# Altium footprint library ACTION标准库.pcblib: 504 footprints (part 4 of 32)
Each footprint in its own frame and in the unit in brackets; x right, y up, seen from the top. Pads: shape width x height; smd on the part's side, far side on the other; paste and mask are expansions set on the pad; w line width, h text height; cw(c..) or ccw(c..) is an arc to the next point about the centre after c.
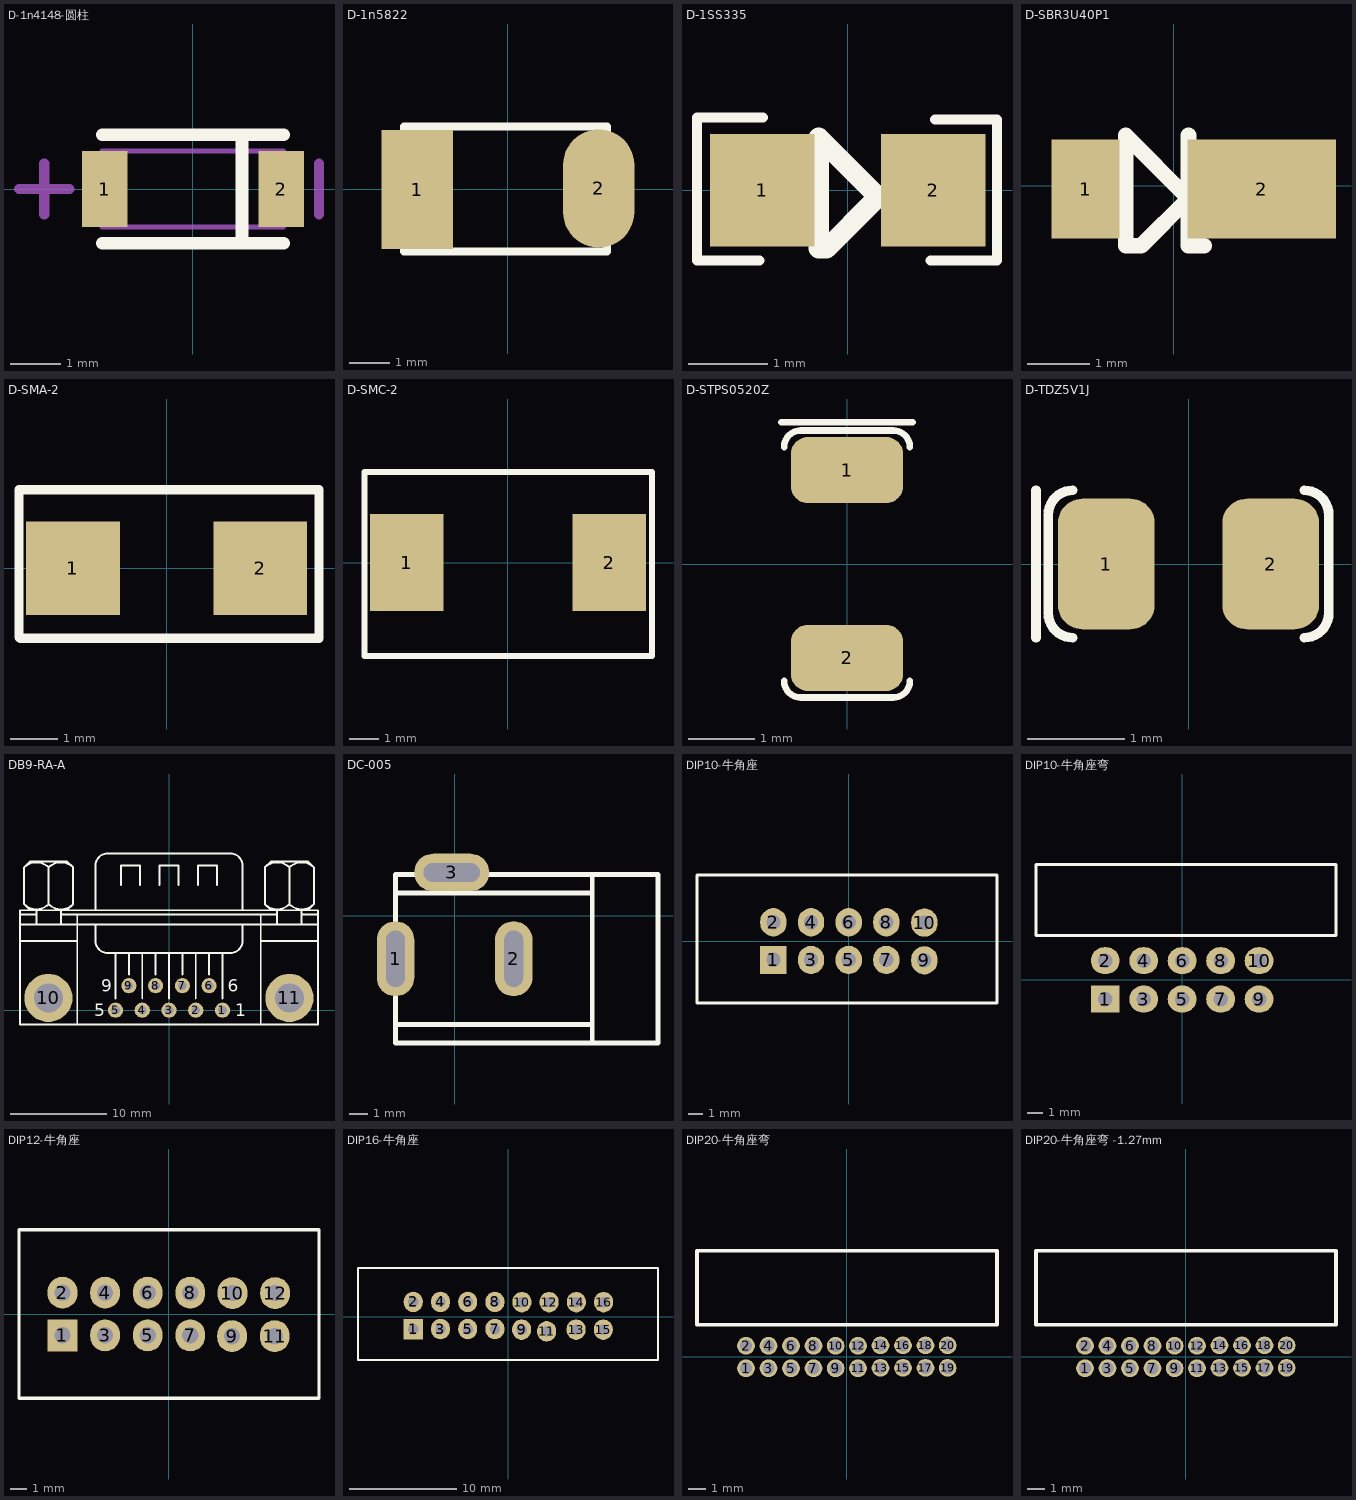
[diagram p3: the footprints below, top view; thin cyan lines are the x and y axes]

## D-1n4148-圆柱 [mm]
pads (2):
  rect 0.9x1.5 smd: 1(-1.75,0) 2(1.75,0)
Top Overlay:
  lines w0.254: -1.8,-1.075 1.8,-1.075 ; -1.8,1.075 1.8,1.075 ; 0.975,-1.075 0.975,1.075
Mechanical 13:
  lines w0.1: -1.8,-0.75 -1.8,0.75 1.8,0.75 1.8,-0.75 -1.8,-0.75
Mechanical 15:
  lines w0.203: -3.45,0 -2.45,0 ; -2.95,-0.5 -2.95,0.5 ; 2.5,-0.5 2.5,0.5
3D body "DIOMELF3414N.STEP": height 1.46, standoff 0.06, extent -1.675,-0.7 1.725,0.7

## D-1n5822 [mil]
pads (2):
  rect 70x116.3 smd: 1(-89,-0.5)
  oval 70x116.3 smd: 2(89,0.5)
Top Overlay:
  lines w7.87: -102,-61.5 97,-61.5 97,61.5 -102,61.5 -102,-61.5
3D body: height 51.18, standoff 0, extent -103,-60.5 97,59.5

## D-1SS335 [mil]
pads (2):
  rect 52x56 smd: 1(-42.5,0) 2(42.5,0)
Top Overlay:
  lines w5: -43.9,-34.84 -74.9,-34.84 -74.9,36 -42.06,36 ; 41.1,-34.84 74.1,-34.84 74.1,35 43.27,35
  lines w10: 13.11,-5.34 -10.51,-28.96 -14.45,-28.96 -14.45,26.16 13.11,-1.4 ; 13.11,-1.4 13.11,-1.4
3D body: height 70, standoff 0, extent -68.64,-28.4 68.36,27.6

## D-SBR3U40P1 [mm]
height 0.5
pads (2):
  rect 1.1x1.6 smd: 1(-1.422,-0.051)
  rect 2.4x1.6 smd: 2(1.422,-0.051)
Top Overlay:
  lines w0.254: 0.241,0.813 0.241,-0.965 0.495,-0.965 ; -0.775,-0.965 -0.775,0.813 0.241,-0.203 -0.521,-0.965 -0.775,-0.965
3D body "User Library-POWERDI-123.STEP": height 1.1, standoff 0.1, extent -1.62,-1.016 2.28,0.914

## D-SMA-2 [mm]
pads (2):
  rect 2x2 smd: 1(-2,0) 2(2,0)
Top Overlay:
  lines w0.2: -3.15,-1.473 -3.15,1.676 3.251,1.676 3.251,-1.499 -3.124,-1.499 -3.15,-1.473
3D body "DO214 SMA.STEP": height 2.41, standoff 0.13, extent -2.692,-1.295 2.794,1.499

## D-SMC-2 [mm]
pads (2):
  rect 2.5x3.3 smd: 1(-3.45,0) 2(3.45,0)
Top Overlay:
  lines w0.2: -4.877,-3.175 4.902,-3.175 4.902,3.073 -4.877,3.073 -4.877,-1.6 -4.877,-3.175
3D body "DO214 SMC.STEP": height 2.27, standoff -0.03, extent -3.899,-3.001 4.051,2.899

## D-STPS0520Z [mm] "肖特基二极管"
pads (2):
  rrect50% 1.7x1 smd: 1(0,1.425) 2(0,-1.425)
Top Overlay:
  lines w0.1: -1,2.152 1,2.152 ; -0.954,-1.771 ccw(c-0.7,-1.771) -0.7,-2.025 0.7,-2.025 ccw(c0.7,-1.771) 0.954,-1.771 ; -0.954,1.771 cw(c-0.7,1.771) -0.7,2.025 0.7,2.025 cw(c0.7,1.771) 0.954,1.771

## D-TDZ5V1J [mm]
pads (2):
  rrect50% 1x1.35 smd: 1(-0.85,0) 2(0.85,0)
Top Overlay:
  lines w0.1: -1.577,-0.762 -1.577,0.762 ; -1.196,-0.762 cw(c-1.196,-0.508) -1.45,-0.508 -1.45,0.508 cw(c-1.196,0.508) -1.196,0.762 ; 1.196,-0.762 ccw(c1.196,-0.508) 1.45,-0.508 1.45,0.508 ccw(c1.196,0.508) 1.196,0.762

## DB9-RA-A [mil]
pads (11):
  round 62 hole 35: 1(218.33,0) 2(109.17,0) 3(0,0) 4(-109.17,0) 5(-218.33,0) 6(163.75,100) 7(54.58,100) 8(-54.58,100) 9(-163.75,100)
  round 196.67 hole 118.33: 10(-492.5,50) 11(491.67,50)
Top Overlay:
  lines w7.87: -608.79,283.07 -374.54,283.07 ; -608.79,349.74 608.79,349.74 ; -608.79,391.4 -541.67,391.4 ; -591.75,432.99 ccw(c-541.67,483.07) -491.58,432.99 ; -591.75,583.16 cw(c-541.67,533.07) -491.58,583.16 ; -566.67,408.07 -591.67,433.07 -591.67,583.07 -566.67,608.07 -416.67,608.07 -391.67,583.07 -391.67,433.07 -416.67,408.07 ; -541.67,349.74 -541.67,408.07 ; -491.75,432.99 ccw(c-441.67,483.07) -391.58,432.99 ; -491.75,583.16 cw(c-441.67,533.07) -391.58,583.16 ; -491.67,433.07 -491.67,583.07 ; -441.67,349.74 -441.67,408.07 ; -441.67,391.4 440.83,391.4 ; -374.54,-59.06 -374.54,391.4 ; -300,349.74 -300,283.07 ccw(c-250,283.07) -250,233.07 ; -300,408.07 -300,590.55 cw(c-250,590.55) -250,640.55 250,640.55 cw(c250,590.55) 300,590.55 300,408.07 ; -218.33,47.24 -218.33,233.07 ; -196.85,511.81 -196.85,590.55 -118.11,590.55 -118.11,511.81 ; -163.75,145.67 -163.75,233.07 ; -109.17,47.24 -109.17,233.07 ; -54.58,145.67 -54.58,233.07 ; -39.37,511.81 -39.37,590.55 0,590.55 39.37,590.55 39.37,511.81 ; 0,47.24 0,233.07 -250,233.07 ; 54.58,145.67 54.58,233.07 ; 109.17,47.24 109.17,233.07 ; 118.11,511.81 118.11,590.55 196.85,590.55 196.85,511.81 ; 163.75,145.67 163.75,233.07 ; 218.33,47.24 218.33,233.07 ; 300,349.74 300,283.07 cw(c250,283.07) 250,233.07 -250,233.07 ; 374.54,-59.06 374.54,391.4 ; 374.54,283.07 608.79,283.07 ; 391.58,432.99 ccw(c441.67,483.07) 491.75,432.99 ; 391.58,583.16 cw(c441.67,533.07) 491.75,583.16 ; 416.67,408.07 391.67,433.07 391.67,583.07 416.67,608.07 566.67,608.07 591.67,583.07 591.67,433.07 566.67,408.07 ; 440.83,349.74 440.83,408.07 ; 491.58,432.99 ccw(c541.66,483.07) 591.75,432.99 ; 491.58,583.16 cw(c541.66,533.07) 591.75,583.16 ; 491.67,433.07 491.67,583.07 ; 540.83,349.74 540.83,408.07 ; 540.83,391.4 608.79,391.4 ; -608.79,-59.06 -366.67,-59.06 366.67,-59.06 608.79,-59.06 608.79,408.07 -608.79,408.07 -608.79,-59.06
  text "6" at 239.68,74.8 h50
  text "1" at 271.18,-25.59 h50
  text "5" at -304.46,-25.59 h50
  text "9" at -275.75,74.8 h50
3D body "User Library-DRB-9M.STEP": height 501.97, standoff -143.7, extent -599.29,-58.8 601.5,638.05

## DC-005 [mm]
pads (3):
  oval 2x4 hole 1 slot 3 at 90 deg: 1(-3.15,-2.3) 2(3.15,-2.3)
  oval 4x2 hole 1 slot 3 at 0 deg: 3(-0.15,2.3)
Top Overlay:
  lines w0.254: -3.15,-5.805 7.34,-5.805 ; -3.15,1.205 7.34,1.205 ; 7.34,-6.796 7.34,2.196 ; -3.15,-6.796 -3.15,2.196 10.845,2.196 10.845,-6.796 -3.15,-6.796
3D body "User Library-dc range - dc connector[4840_2201].STEP": height 11.02, standoff -3.48, extent -3.193,-6.803 10.633,2.703

## DIP10-牛角座 [mil]
pads (10):
  rect 70x75 hole 38: 1(-200.5,-49.5)
  oval 70x75 hole 38: 2(-200.5,50.5) 3(-100.5,-49.5) 4(-100.5,50.5) 5(-0.5,-49.5) 6(-0.5,50.5) 7(99.5,-49.5) 8(99.5,50.5) 9(200.5,-50.5) 10(200.5,49.5)
Top Overlay:
  lines w7.87: -403.5,-163.5 393.5,-163.5 393.5,175.5 -403.5,175.5 -403.5,-163.5
3D body "BH-10.STEP": height 348.1, standoff -129.92, extent -406.29,-171.7 395.29,190.5

## DIP10-牛角座弯 [mil] "Connector; Header; 7x2 Position"
height 23.62
pads (10):
  rect 75x70 hole 38: 1(-200,-50)
  oval 75x70 hole 38: 2(-200,50) 3(-100,-50) 4(-100,50) 5(0,-50) 6(0,50) 7(100,-50) 8(100,50) 9(200,-50) 10(200,50)
Top Overlay:
  lines w7.87: -380,115 -380,300 400,300 400,115 -380,115

## DIP12-牛角座 [mil]
pads (12):
  rect 70x75 hole 38: 1(-249.5,-49)
  oval 70x75 hole 38: 2(-249.5,51) 3(-149.5,-49) 4(-149.5,51) 5(-49.5,-49) 6(-49.5,51) 7(50.5,-49) 8(50.5,51) 9(148.5,-51) 10(149.5,50) 11(248.5,-51) 12(249.5,50)
Top Overlay:
  lines w7.87: -351.5,-197 352.5,-197 352.5,199 -351.5,199 -351.5,-197
3D body "牛角座-12P-2.54直针.stp": height 128.74, standoff -414.57, extent -346.56,-187.92 345.57,195.94

## DIP16-牛角座 [mil]
pads (16):
  rect 70x75 hole 38: 1(-349.5,-46)
  oval 70x75 hole 38: 2(-349.5,54) 3(-249.5,-46) 4(-249.5,54) 5(-149.5,-46) 6(-149.5,54) 7(-49.5,-46) 8(-49.5,54) 9(48.5,-48) 10(49.5,53) 11(140.5,-54) 12(149.5,53) 13(248.5,-48) 14(249.5,53) 15(348.5,-48) 16(349.5,53)
Top Overlay:
  lines w7.87: -552.5,-160 549.5,-160 549.5,179 -552.5,179 -552.5,-160
3D body "BH-16.STEP": height 348.1, standoff -129.92, extent -548.29,-170.2 553.29,192

## DIP20-牛角座弯 [mm]
pads (20):
  round 1 hole 0.7: 1(-5.692,-0.648) 2(-5.692,0.622) 3(-4.422,-0.648) 4(-4.422,0.622) 5(-3.152,-0.648) 6(-3.152,0.622) 7(-1.882,-0.648) 8(-1.882,0.622) 9(-0.632,-0.648) 10(-0.632,0.622) 11(0.632,-0.648) 12(0.632,0.622) 13(1.902,-0.622) 14(1.902,0.648) 15(3.172,-0.622) 16(3.172,0.648) 17(4.442,-0.622) 18(4.442,0.648) 19(5.692,-0.622) 20(5.692,0.648)
Top Overlay:
  lines w0.198: -8.461,1.816 -8.461,5.982 8.481,5.982 8.481,1.816 -8.436,1.816

## DIP20-牛角座弯 -1.27mm [mm]
pads (20):
  round 1 hole 0.7: 1(-5.692,-0.648) 2(-5.692,0.622) 3(-4.422,-0.648) 4(-4.422,0.622) 5(-3.152,-0.648) 6(-3.152,0.622) 7(-1.882,-0.648) 8(-1.882,0.622) 9(-0.632,-0.648) 10(-0.632,0.622) 11(0.632,-0.648) 12(0.632,0.622) 13(1.902,-0.622) 14(1.902,0.648) 15(3.172,-0.622) 16(3.172,0.648) 17(4.442,-0.622) 18(4.442,0.648) 19(5.692,-0.622) 20(5.692,0.648)
Top Overlay:
  lines w0.198: -8.461,1.816 -8.461,5.982 8.481,5.982 8.481,1.816 -8.436,1.816